# Altium schematic symbol library TI - ADC.SchLib: 2198 symbols (part 36 of 130)
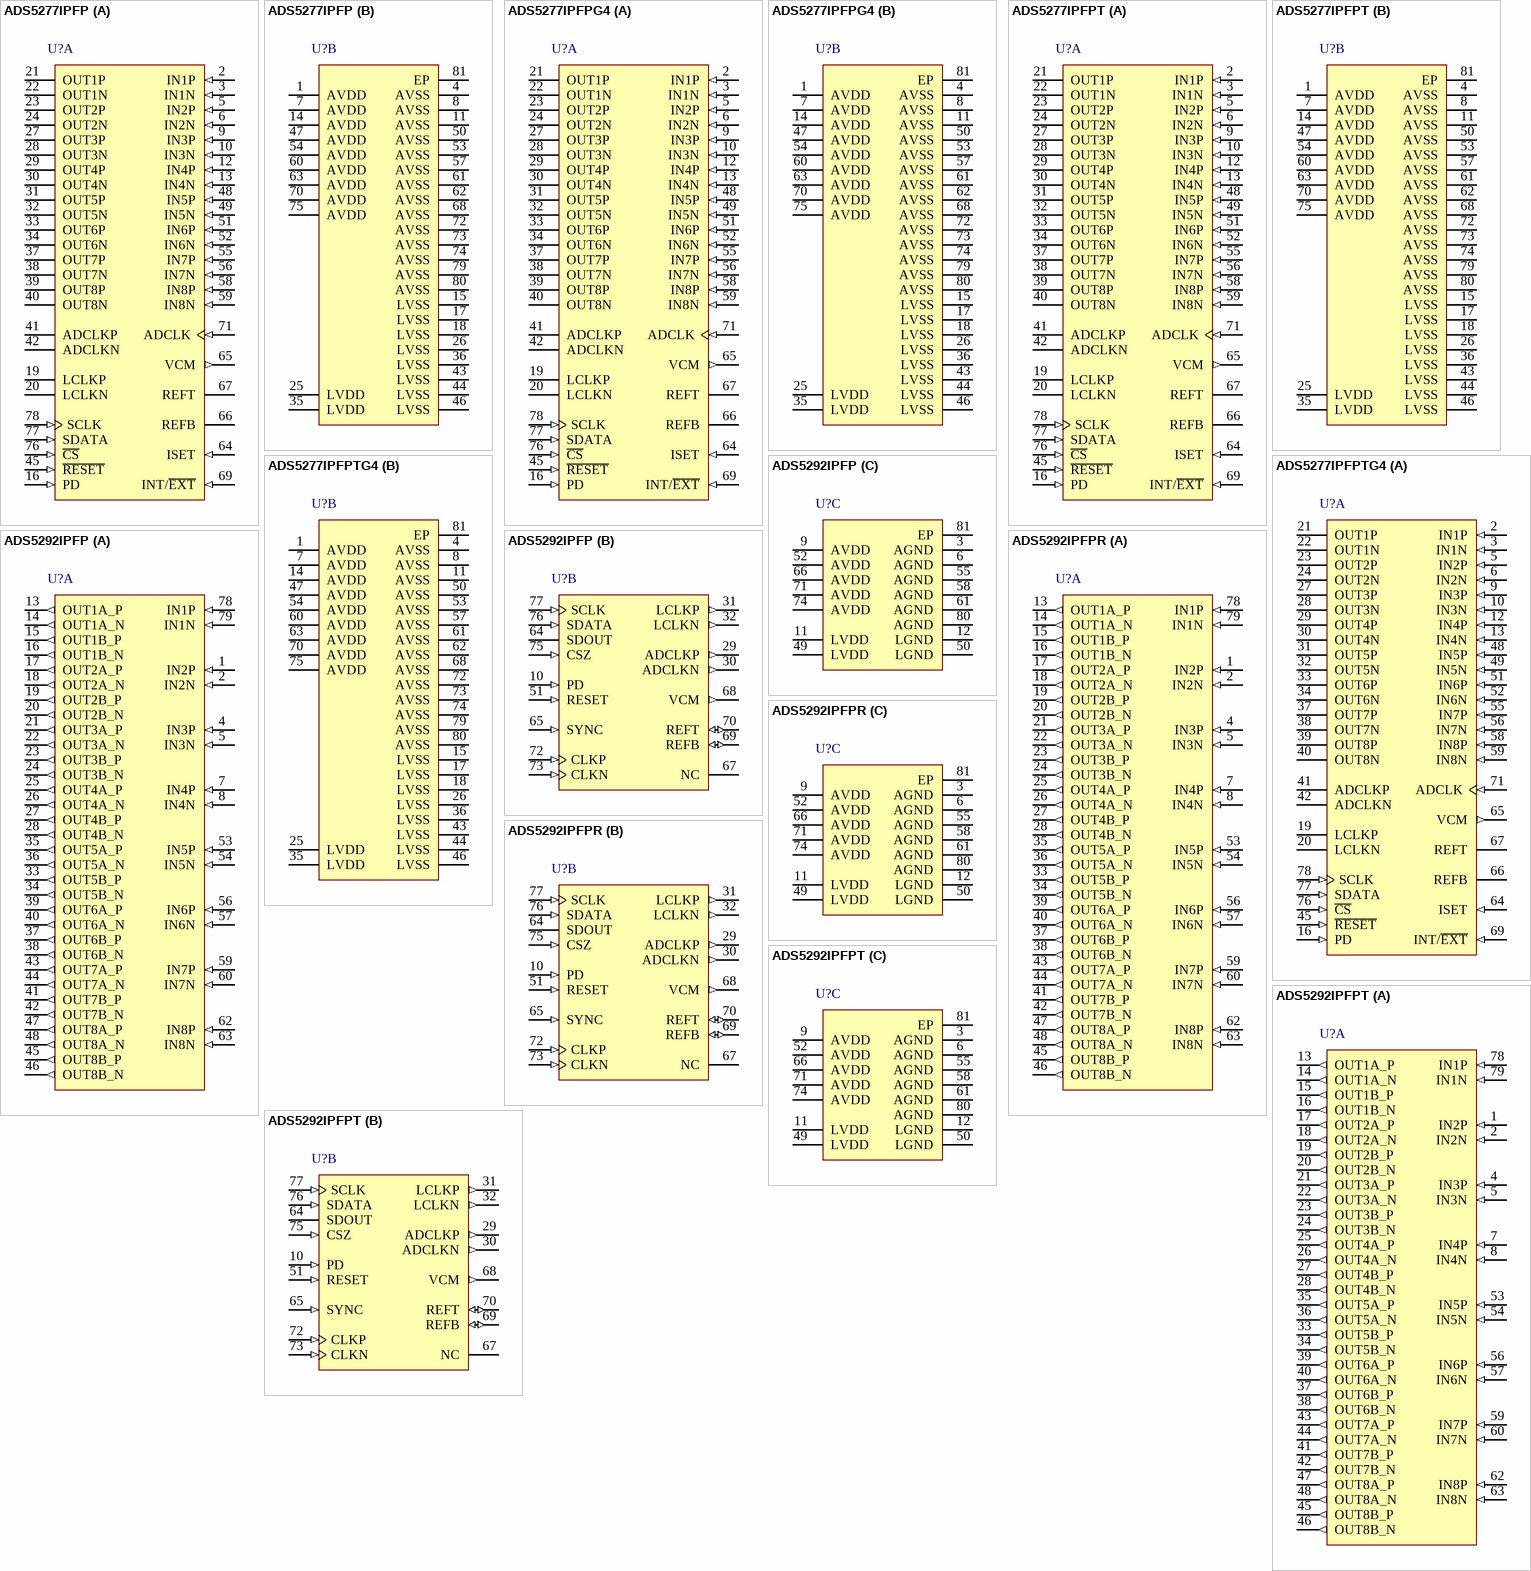
[diagram p161: symbols ADS5277IPFP to ADS5292IPFPT]

## ADS5292IPFP
designator U?
Octal Channel 12-Bit, 80 MSPS High-SNR and Low-Power ADC, -40 to 85 degC, 80-pin QFP (PFP80), Green (RoHS & no Sb/Br); Manufacturer: Texas Instruments; PartNumber: ADS5292IPFP; # Input Channels: 8; Analog Voltage AV/DD(Max)(V): 1.9; Analog Voltage AV/DD(Min)(V): 1.7; Architecture: Pipeline; ENOB(Bits): 11.3; INL(Max)(+/-LSB): 1; Interface: Parallel LVDS; Resolution(Bits): 12; Sample Rate (max)(SPS): 80M; SFDR(dB): 85; SINAD(dB): 69.8; SNR(dB): 71.5; SubFamily: High Speed ADC (>10MSPS); DatasheetVersion: SLAS788B; PackageVersion: 4146925/C, 07/2011; PackageReference: PFP80-6825X6825TP; PackageDescription: 80-Pin PowerPAD(TM) Plastic Quad Flatpack, Body 12 x 12 mm, Pitch 0.5 mm; Supplier 1: Digi-Key; Supplier Part Number 1: THS12082IDARG4-ND; Digital Supply(Max)(V): 1.9; Digital Supply(Min)(V): 1.7; Eco-Plan: Green (RoHS & no Sb/Br); Mounting Technology: Surface Mount; Code_JEDEC: MS-026; ComponentLink1Description: Manufacturer URL; ComponentLink1URL: http://www.ti.com/; ComponentLink2Description: Datasheet; ComponentLink2URL: http://www.ti.com/general/docs/lit/getliterature.tsp?genericPartNumber=ADS5292&fileType=pdf; ComponentLink3Description: Package Specification; ComponentLink3URL: http://www.ti.com/litv/pdf/mpqf049b
footprint TI-PFP80-6825X6825TP_N (QFP, 80-Leads, Body 12x12mm, Pitch 0.5mm, Thermal Pad 7.5x7.5mm, IPC Medium Density)
footprint TI-PFP80-6825X6825TP_L (QFP, 80-Leads, Body 12x12mm, Pitch 0.5mm, Thermal Pad 7.5x7.5mm, IPC High Density)
footprint TI-PFP80-6825X6825TP_M (QFP, 80-Leads, Body 12x12mm, Pitch 0.5mm, Thermal Pad 7.5x7.5mm, IPC Low Density)
part A pins: 1 IN2P (in) "Differential input signal, Channel 2", 2 IN2N (in) "Differential input signal, Channel 2", 4 IN3P (in) "Differential input signal, Channel 3", 5 IN3N (in) "Differential input signal, Channel 3", 7 IN4P (in) "Differential input signal, Channel 4", 8 IN4N (in) "Differential input signal, Channel 4", 13 OUT1A_P (out) "Differential LVDS data output, wire 1, channel 1", 14 OUT1A_N (out) "Differential LVDS data output, wire 1, channel 1", 15 OUT1B_P (out) "Differential LVDS data output, wire 2, channel 1", 16 OUT1B_N (out) "Differential LVDS data output, wire 2, channel 1", 17 OUT2A_P (out) "Differential LVDS data output, wire 1, channel 2", 18 OUT2A_N (out) "Differential LVDS data output, wire 1, channel 2", 19 OUT2B_P (out) "Differential LVDS data output, wire 2, channel 2", 20 OUT2B_N (out) "Differential LVDS data output, wire 2, channel 2", 21 OUT3A_P (out) "Differential LVDS data output, wire 1, channel 3", 22 OUT3A_N (out) "Differential LVDS data output, wire 1, channel 3", 23 OUT3B_P (out) "Differential LVDS data output, wire 2, channel 3", 24 OUT3B_N (out) "Differential LVDS data output, wire 2, channel 3", 25 OUT4A_P (out) "Differential LVDS data output, wire 1, channel 4", 26 OUT4A_N (out) "Differential LVDS data output, wire 1, channel 4", 27 OUT4B_P (out) "Differential LVDS data output, wire 2, channel 4", 28 OUT4B_N (out) "Differential LVDS data output, wire 2, channel 4", 33 OUT5B_P (out) "Differential LVDS data output, wire 2, channel 5", 34 OUT5B_N (out) "Differential LVDS data output, wire 2, channel 5", 35 OUT5A_P (out) "Differential LVDS data output, wire 1, channel 5", 36 OUT5A_N (out) "Differential LVDS data output, wire 1, channel 5", 37 OUT6B_P (out) "Differential LVDS data output, wire 2, channel 6", 38 OUT6B_N (out) "Differential LVDS data output, wire 2, channel 6", 39 OUT6A_P (out) "Differential LVDS data output, wire 1, channel 6", 40 OUT6A_N (out) "Differential LVDS data output, wire 1, channel 6", 41 OUT7B_P (out) "Differential LVDS data output, wire 2, channel 7", 42 OUT7B_N (out) "Differential LVDS data output, wire 2, channel 7", 43 OUT7A_P (out) "Differential LVDS data output, wire 1, channel 7", 44 OUT7A_N (out) "Differential LVDS data output, wire 1, channel 7", 45 OUT8B_P (out) "Differential LVDS data output, wire 2, channel 8", 46 OUT8B_N (out) "Differential LVDS data output, wire 2, channel 8", 47 OUT8A_P (out) "Differential LVDS data output, wire 1, channel 8", 48 OUT8A_N (out) "Differential LVDS data output, wire 1, channel 8", 53 IN5P (in) "Differential input signal, Channel 5", 54 IN5N (in) "Differential input signal, Channel 5", 56 IN6P (in) "Differential input signal, Channel 6", 57 IN6N (in) "Differential input signal, Channel 6", 59 IN7P (in) "Differential input signal, Channel 7", 60 IN7N (in) "Differential input signal, Channel 7", 62 IN8P (in) "Differential input signal, Channel 8", 63 IN8N (in) "Differential input signal, Channel 8", 78 IN1P (in) "Differential input signal, Channel 1", 79 IN1N (in) "Differential input signal, Channel 1"
part B pins: 10 PD (in) "Power down control input. Active High. The pin has an internal 220-kO pulldown resistor.", 29 ADCLKP (out) "Differential LVDS frame clock (1X)", 30 ADCLKN (out) "Differential LVDS frame clock (1X)", 31 LCLKP (out) "Differential LVDS bit clock (7X)", 32 LCLKN (out) "Differential LVDS bit clock (7X)", 51 RESET (in) "Active HIGH RESET input. The pin has an internal 220-kO pulldown resistor.", 64 SDOUT (hiz) "Serial data readout. This pin is in the high-impedance state after reset. When the <READOUT> bit is set, the SDOUT pin becomes active. This is a CMOS digital output running from the AVDD supply.", 65 SYNC (in) "Input signal to synchronize channels and chips when used with reduced output data rates. If it is not used, add a =< 10 Kohm pull-down resistor.", 67 NC "No Connection. Must leave floated", 68 VCM (out) "Common-mode output pin, 0.95-V output", 69 REFB (io) "Negative reference input/ output", 70 REFT (io) "Positive reference input/ output", 72 CLKP (in) "Positive differential clock", 73 CLKN (in) "Negative differential clock -Tie CLKN to GND for single-ended clock", 75 CSZ (in) "Serial enable chip select - active low digital input", 76 SDATA (in) "Serial data input. The pin has an internal 220-kO pulldown resistor.", 77 SCLK (in) "Serial clock input. The pin has an internal 220-kohm pulldown resistor."
part C pins: 3 AGND (power) "Analog ground", 6 AGND (power) "Analog ground", 9 AVDD (power) "Analog supply pin, 1.8 V", 11 LVDD (power) "Digital and I/O power supply, 1.8 V", 12 LGND (power) "Digital ground", 49 LVDD (power) "Digital and I/O power supply, 1.8 V", 50 LGND (power) "Digital ground", 52 AVDD (power) "Analog supply pin, 1.8 V", 55 AGND (power) "Analog ground", 58 AGND (power) "Analog ground", 61 AGND (power) "Analog ground", 66 AVDD (power) "Analog supply pin, 1.8 V", 71 AVDD (power) "Analog supply pin, 1.8 V", 74 AVDD (power) "Analog supply pin, 1.8 V", 80 AGND (power) "Analog ground", 81 EP (power)

## ADS5292IPFPR
designator U?
Octal Channel 12-Bit, 80 MSPS High-SNR and Low-Power ADC, -40 to 85 degC, 80-pin QFP (PFP80), Green (RoHS & no Sb/Br); Manufacturer: Texas Instruments; PartNumber: ADS5292IPFPR; # Input Channels: 8; Analog Voltage AV/DD(Max)(V): 1.9; Analog Voltage AV/DD(Min)(V): 1.7; Architecture: Pipeline; ENOB(Bits): 11.3; INL(Max)(+/-LSB): 1; Interface: Parallel LVDS; Resolution(Bits): 12; Sample Rate (max)(SPS): 80M; SFDR(dB): 85; SINAD(dB): 69.8; SNR(dB): 71.5; SubFamily: High Speed ADC (>10MSPS); DatasheetVersion: SLAS788B; PackageVersion: 4146925/C, 07/2011; PackageReference: PFP80-6825X6825TP; PackageDescription: 80-Pin PowerPAD(TM) Plastic Quad Flatpack, Body 12 x 12 mm, Pitch 0.5 mm; Supplier 1: Mouser; Supplier Part Number 1: N/A; Digital Supply(Max)(V): 1.9; Digital Supply(Min)(V): 1.7; Eco-Plan: Green (RoHS & no Sb/Br); Mounting Technology: Surface Mount; Code_JEDEC: MS-026; ComponentLink1Description: Manufacturer URL; ComponentLink1URL: http://www.ti.com/; ComponentLink2Description: Datasheet; ComponentLink2URL: http://www.ti.com/general/docs/lit/getliterature.tsp?genericPartNumber=ADS5292&fileType=pdf; ComponentLink3Description: Package Specification; ComponentLink3URL: http://www.ti.com/litv/pdf/mpqf049b
footprint TI-PFP80-6825X6825TP_N (QFP, 80-Leads, Body 12x12mm, Pitch 0.5mm, Thermal Pad 7.5x7.5mm, IPC Medium Density)
footprint TI-PFP80-6825X6825TP_L (QFP, 80-Leads, Body 12x12mm, Pitch 0.5mm, Thermal Pad 7.5x7.5mm, IPC High Density)
footprint TI-PFP80-6825X6825TP_M (QFP, 80-Leads, Body 12x12mm, Pitch 0.5mm, Thermal Pad 7.5x7.5mm, IPC Low Density)
part A pins: 1 IN2P (in) "Differential input signal, Channel 2", 2 IN2N (in) "Differential input signal, Channel 2", 4 IN3P (in) "Differential input signal, Channel 3", 5 IN3N (in) "Differential input signal, Channel 3", 7 IN4P (in) "Differential input signal, Channel 4", 8 IN4N (in) "Differential input signal, Channel 4", 13 OUT1A_P (out) "Differential LVDS data output, wire 1, channel 1", 14 OUT1A_N (out) "Differential LVDS data output, wire 1, channel 1", 15 OUT1B_P (out) "Differential LVDS data output, wire 2, channel 1", 16 OUT1B_N (out) "Differential LVDS data output, wire 2, channel 1", 17 OUT2A_P (out) "Differential LVDS data output, wire 1, channel 2", 18 OUT2A_N (out) "Differential LVDS data output, wire 1, channel 2", 19 OUT2B_P (out) "Differential LVDS data output, wire 2, channel 2", 20 OUT2B_N (out) "Differential LVDS data output, wire 2, channel 2", 21 OUT3A_P (out) "Differential LVDS data output, wire 1, channel 3", 22 OUT3A_N (out) "Differential LVDS data output, wire 1, channel 3", 23 OUT3B_P (out) "Differential LVDS data output, wire 2, channel 3", 24 OUT3B_N (out) "Differential LVDS data output, wire 2, channel 3", 25 OUT4A_P (out) "Differential LVDS data output, wire 1, channel 4", 26 OUT4A_N (out) "Differential LVDS data output, wire 1, channel 4", 27 OUT4B_P (out) "Differential LVDS data output, wire 2, channel 4", 28 OUT4B_N (out) "Differential LVDS data output, wire 2, channel 4", 33 OUT5B_P (out) "Differential LVDS data output, wire 2, channel 5", 34 OUT5B_N (out) "Differential LVDS data output, wire 2, channel 5", 35 OUT5A_P (out) "Differential LVDS data output, wire 1, channel 5", 36 OUT5A_N (out) "Differential LVDS data output, wire 1, channel 5", 37 OUT6B_P (out) "Differential LVDS data output, wire 2, channel 6", 38 OUT6B_N (out) "Differential LVDS data output, wire 2, channel 6", 39 OUT6A_P (out) "Differential LVDS data output, wire 1, channel 6", 40 OUT6A_N (out) "Differential LVDS data output, wire 1, channel 6", 41 OUT7B_P (out) "Differential LVDS data output, wire 2, channel 7", 42 OUT7B_N (out) "Differential LVDS data output, wire 2, channel 7", 43 OUT7A_P (out) "Differential LVDS data output, wire 1, channel 7", 44 OUT7A_N (out) "Differential LVDS data output, wire 1, channel 7", 45 OUT8B_P (out) "Differential LVDS data output, wire 2, channel 8", 46 OUT8B_N (out) "Differential LVDS data output, wire 2, channel 8", 47 OUT8A_P (out) "Differential LVDS data output, wire 1, channel 8", 48 OUT8A_N (out) "Differential LVDS data output, wire 1, channel 8", 53 IN5P (in) "Differential input signal, Channel 5", 54 IN5N (in) "Differential input signal, Channel 5", 56 IN6P (in) "Differential input signal, Channel 6", 57 IN6N (in) "Differential input signal, Channel 6", 59 IN7P (in) "Differential input signal, Channel 7", 60 IN7N (in) "Differential input signal, Channel 7", 62 IN8P (in) "Differential input signal, Channel 8", 63 IN8N (in) "Differential input signal, Channel 8", 78 IN1P (in) "Differential input signal, Channel 1", 79 IN1N (in) "Differential input signal, Channel 1"
part B pins: 10 PD (in) "Power down control input. Active High. The pin has an internal 220-kO pulldown resistor.", 29 ADCLKP (out) "Differential LVDS frame clock (1X)", 30 ADCLKN (out) "Differential LVDS frame clock (1X)", 31 LCLKP (out) "Differential LVDS bit clock (7X)", 32 LCLKN (out) "Differential LVDS bit clock (7X)", 51 RESET (in) "Active HIGH RESET input. The pin has an internal 220-kO pulldown resistor.", 64 SDOUT (hiz) "Serial data readout. This pin is in the high-impedance state after reset. When the <READOUT> bit is set, the SDOUT pin becomes active. This is a CMOS digital output running from the AVDD supply.", 65 SYNC (in) "Input signal to synchronize channels and chips when used with reduced output data rates. If it is not used, add a =< 10 Kohm pull-down resistor.", 67 NC "No Connection. Must leave floated", 68 VCM (out) "Common-mode output pin, 0.95-V output", 69 REFB (io) "Negative reference input/ output", 70 REFT (io) "Positive reference input/ output", 72 CLKP (in) "Positive differential clock", 73 CLKN (in) "Negative differential clock -Tie CLKN to GND for single-ended clock", 75 CSZ (in) "Serial enable chip select - active low digital input", 76 SDATA (in) "Serial data input. The pin has an internal 220-kO pulldown resistor.", 77 SCLK (in) "Serial clock input. The pin has an internal 220-kohm pulldown resistor."
part C pins: 3 AGND (power) "Analog ground", 6 AGND (power) "Analog ground", 9 AVDD (power) "Analog supply pin, 1.8 V", 11 LVDD (power) "Digital and I/O power supply, 1.8 V", 12 LGND (power) "Digital ground", 49 LVDD (power) "Digital and I/O power supply, 1.8 V", 50 LGND (power) "Digital ground", 52 AVDD (power) "Analog supply pin, 1.8 V", 55 AGND (power) "Analog ground", 58 AGND (power) "Analog ground", 61 AGND (power) "Analog ground", 66 AVDD (power) "Analog supply pin, 1.8 V", 71 AVDD (power) "Analog supply pin, 1.8 V", 74 AVDD (power) "Analog supply pin, 1.8 V", 80 AGND (power) "Analog ground", 81 EP (power)

## ADS5292IPFPT
designator U?
Octal Channel 12-Bit, 80 MSPS High-SNR and Low-Power ADC, -40 to 85 degC, 80-pin QFP (PFP80), Green (RoHS & no Sb/Br); Manufacturer: Texas Instruments; PartNumber: ADS5292IPFPT; # Input Channels: 8; Analog Voltage AV/DD(Max)(V): 1.9; Analog Voltage AV/DD(Min)(V): 1.7; Architecture: Pipeline; ENOB(Bits): 11.3; INL(Max)(+/-LSB): 1; Interface: Parallel LVDS; Resolution(Bits): 12; Sample Rate (max)(SPS): 80M; SFDR(dB): 85; SINAD(dB): 69.8; SNR(dB): 71.5; SubFamily: High Speed ADC (>10MSPS); DatasheetVersion: SLAS788B; PackageVersion: 4146925/C, 07/2011; PackageReference: PFP80-6825X6825TP; PackageDescription: 80-Pin PowerPAD(TM) Plastic Quad Flatpack, Body 12 x 12 mm, Pitch 0.5 mm; Supplier 1: Mouser; Supplier Part Number 1: N/A; Digital Supply(Max)(V): 1.9; Digital Supply(Min)(V): 1.7; Eco-Plan: Green (RoHS & no Sb/Br); Mounting Technology: Surface Mount; Code_JEDEC: MS-026; ComponentLink1Description: Manufacturer URL; ComponentLink1URL: http://www.ti.com/; ComponentLink2Description: Datasheet; ComponentLink2URL: http://www.ti.com/general/docs/lit/getliterature.tsp?genericPartNumber=ADS5292&fileType=pdf; ComponentLink3Description: Package Specification; ComponentLink3URL: http://www.ti.com/litv/pdf/mpqf049b
footprint TI-PFP80-6825X6825TP_N (QFP, 80-Leads, Body 12x12mm, Pitch 0.5mm, Thermal Pad 7.5x7.5mm, IPC Medium Density)
footprint TI-PFP80-6825X6825TP_L (QFP, 80-Leads, Body 12x12mm, Pitch 0.5mm, Thermal Pad 7.5x7.5mm, IPC High Density)
footprint TI-PFP80-6825X6825TP_M (QFP, 80-Leads, Body 12x12mm, Pitch 0.5mm, Thermal Pad 7.5x7.5mm, IPC Low Density)
part A pins: 1 IN2P (in) "Differential input signal, Channel 2", 2 IN2N (in) "Differential input signal, Channel 2", 4 IN3P (in) "Differential input signal, Channel 3", 5 IN3N (in) "Differential input signal, Channel 3", 7 IN4P (in) "Differential input signal, Channel 4", 8 IN4N (in) "Differential input signal, Channel 4", 13 OUT1A_P (out) "Differential LVDS data output, wire 1, channel 1", 14 OUT1A_N (out) "Differential LVDS data output, wire 1, channel 1", 15 OUT1B_P (out) "Differential LVDS data output, wire 2, channel 1", 16 OUT1B_N (out) "Differential LVDS data output, wire 2, channel 1", 17 OUT2A_P (out) "Differential LVDS data output, wire 1, channel 2", 18 OUT2A_N (out) "Differential LVDS data output, wire 1, channel 2", 19 OUT2B_P (out) "Differential LVDS data output, wire 2, channel 2", 20 OUT2B_N (out) "Differential LVDS data output, wire 2, channel 2", 21 OUT3A_P (out) "Differential LVDS data output, wire 1, channel 3", 22 OUT3A_N (out) "Differential LVDS data output, wire 1, channel 3", 23 OUT3B_P (out) "Differential LVDS data output, wire 2, channel 3", 24 OUT3B_N (out) "Differential LVDS data output, wire 2, channel 3", 25 OUT4A_P (out) "Differential LVDS data output, wire 1, channel 4", 26 OUT4A_N (out) "Differential LVDS data output, wire 1, channel 4", 27 OUT4B_P (out) "Differential LVDS data output, wire 2, channel 4", 28 OUT4B_N (out) "Differential LVDS data output, wire 2, channel 4", 33 OUT5B_P (out) "Differential LVDS data output, wire 2, channel 5", 34 OUT5B_N (out) "Differential LVDS data output, wire 2, channel 5", 35 OUT5A_P (out) "Differential LVDS data output, wire 1, channel 5", 36 OUT5A_N (out) "Differential LVDS data output, wire 1, channel 5", 37 OUT6B_P (out) "Differential LVDS data output, wire 2, channel 6", 38 OUT6B_N (out) "Differential LVDS data output, wire 2, channel 6", 39 OUT6A_P (out) "Differential LVDS data output, wire 1, channel 6", 40 OUT6A_N (out) "Differential LVDS data output, wire 1, channel 6", 41 OUT7B_P (out) "Differential LVDS data output, wire 2, channel 7", 42 OUT7B_N (out) "Differential LVDS data output, wire 2, channel 7", 43 OUT7A_P (out) "Differential LVDS data output, wire 1, channel 7", 44 OUT7A_N (out) "Differential LVDS data output, wire 1, channel 7", 45 OUT8B_P (out) "Differential LVDS data output, wire 2, channel 8", 46 OUT8B_N (out) "Differential LVDS data output, wire 2, channel 8", 47 OUT8A_P (out) "Differential LVDS data output, wire 1, channel 8", 48 OUT8A_N (out) "Differential LVDS data output, wire 1, channel 8", 53 IN5P (in) "Differential input signal, Channel 5", 54 IN5N (in) "Differential input signal, Channel 5", 56 IN6P (in) "Differential input signal, Channel 6", 57 IN6N (in) "Differential input signal, Channel 6", 59 IN7P (in) "Differential input signal, Channel 7", 60 IN7N (in) "Differential input signal, Channel 7", 62 IN8P (in) "Differential input signal, Channel 8", 63 IN8N (in) "Differential input signal, Channel 8", 78 IN1P (in) "Differential input signal, Channel 1", 79 IN1N (in) "Differential input signal, Channel 1"
part B pins: 10 PD (in) "Power down control input. Active High. The pin has an internal 220-kO pulldown resistor.", 29 ADCLKP (out) "Differential LVDS frame clock (1X)", 30 ADCLKN (out) "Differential LVDS frame clock (1X)", 31 LCLKP (out) "Differential LVDS bit clock (7X)", 32 LCLKN (out) "Differential LVDS bit clock (7X)", 51 RESET (in) "Active HIGH RESET input. The pin has an internal 220-kO pulldown resistor.", 64 SDOUT (hiz) "Serial data readout. This pin is in the high-impedance state after reset. When the <READOUT> bit is set, the SDOUT pin becomes active. This is a CMOS digital output running from the AVDD supply.", 65 SYNC (in) "Input signal to synchronize channels and chips when used with reduced output data rates. If it is not used, add a =< 10 Kohm pull-down resistor.", 67 NC "No Connection. Must leave floated", 68 VCM (out) "Common-mode output pin, 0.95-V output", 69 REFB (io) "Negative reference input/ output", 70 REFT (io) "Positive reference input/ output", 72 CLKP (in) "Positive differential clock", 73 CLKN (in) "Negative differential clock -Tie CLKN to GND for single-ended clock", 75 CSZ (in) "Serial enable chip select - active low digital input", 76 SDATA (in) "Serial data input. The pin has an internal 220-kO pulldown resistor.", 77 SCLK (in) "Serial clock input. The pin has an internal 220-kohm pulldown resistor."
part C pins: 3 AGND (power) "Analog ground", 6 AGND (power) "Analog ground", 9 AVDD (power) "Analog supply pin, 1.8 V", 11 LVDD (power) "Digital and I/O power supply, 1.8 V", 12 LGND (power) "Digital ground", 49 LVDD (power) "Digital and I/O power supply, 1.8 V", 50 LGND (power) "Digital ground", 52 AVDD (power) "Analog supply pin, 1.8 V", 55 AGND (power) "Analog ground", 58 AGND (power) "Analog ground", 61 AGND (power) "Analog ground", 66 AVDD (power) "Analog supply pin, 1.8 V", 71 AVDD (power) "Analog supply pin, 1.8 V", 74 AVDD (power) "Analog supply pin, 1.8 V", 80 AGND (power) "Analog ground", 81 EP (power)

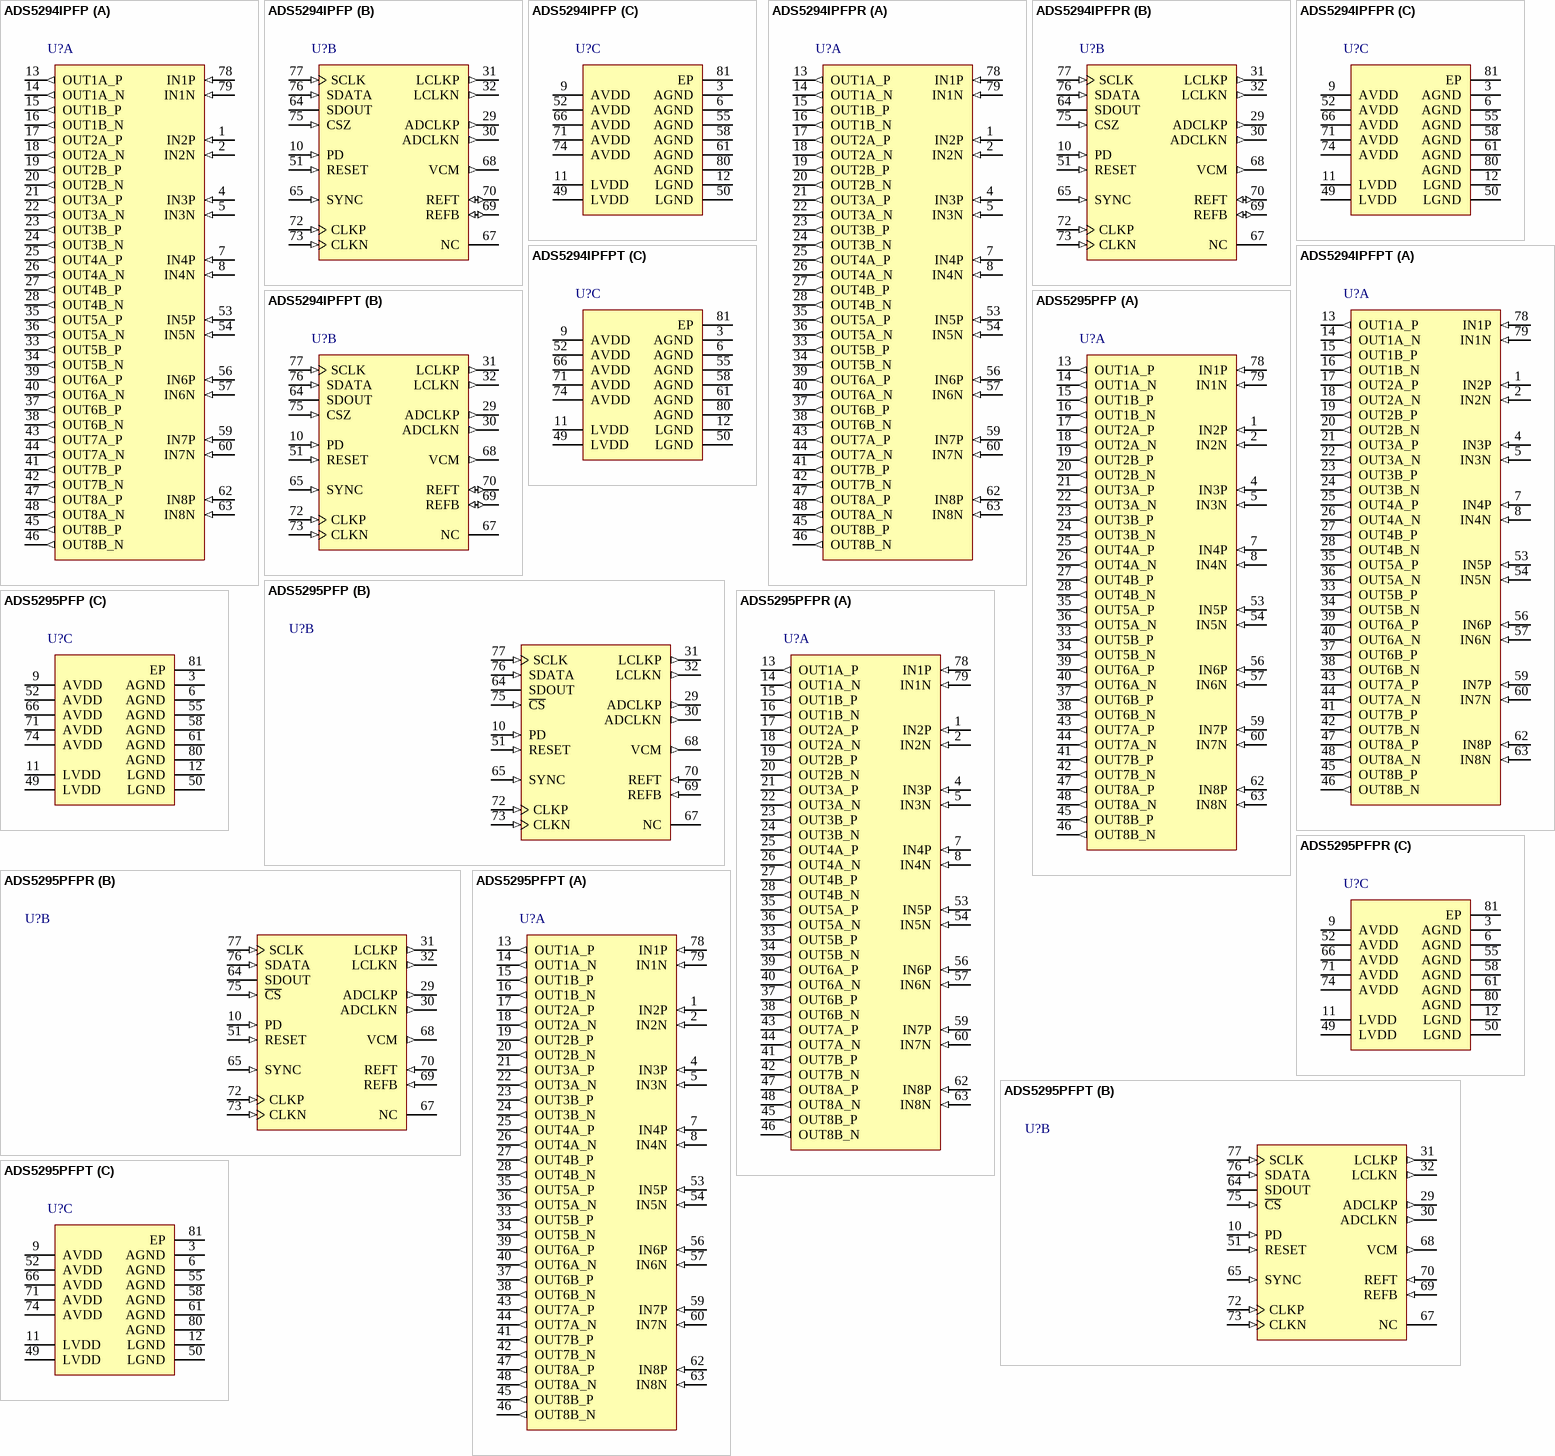
[diagram p44: symbols ADS5294IPFP to ADS5295PFPT]
